# Altium footprint library Standard2.PcbLib: 423 footprints (part 21 of 27)
Each footprint in its own frame and in the unit in brackets; x right, y up, seen from the top. Pads: shape width x height; smd on the part's side, far side on the other; paste and mask are expansions set on the pad; w line width, h text height; cw(c..) or ccw(c..) is an arc to the next point about the centre after c.
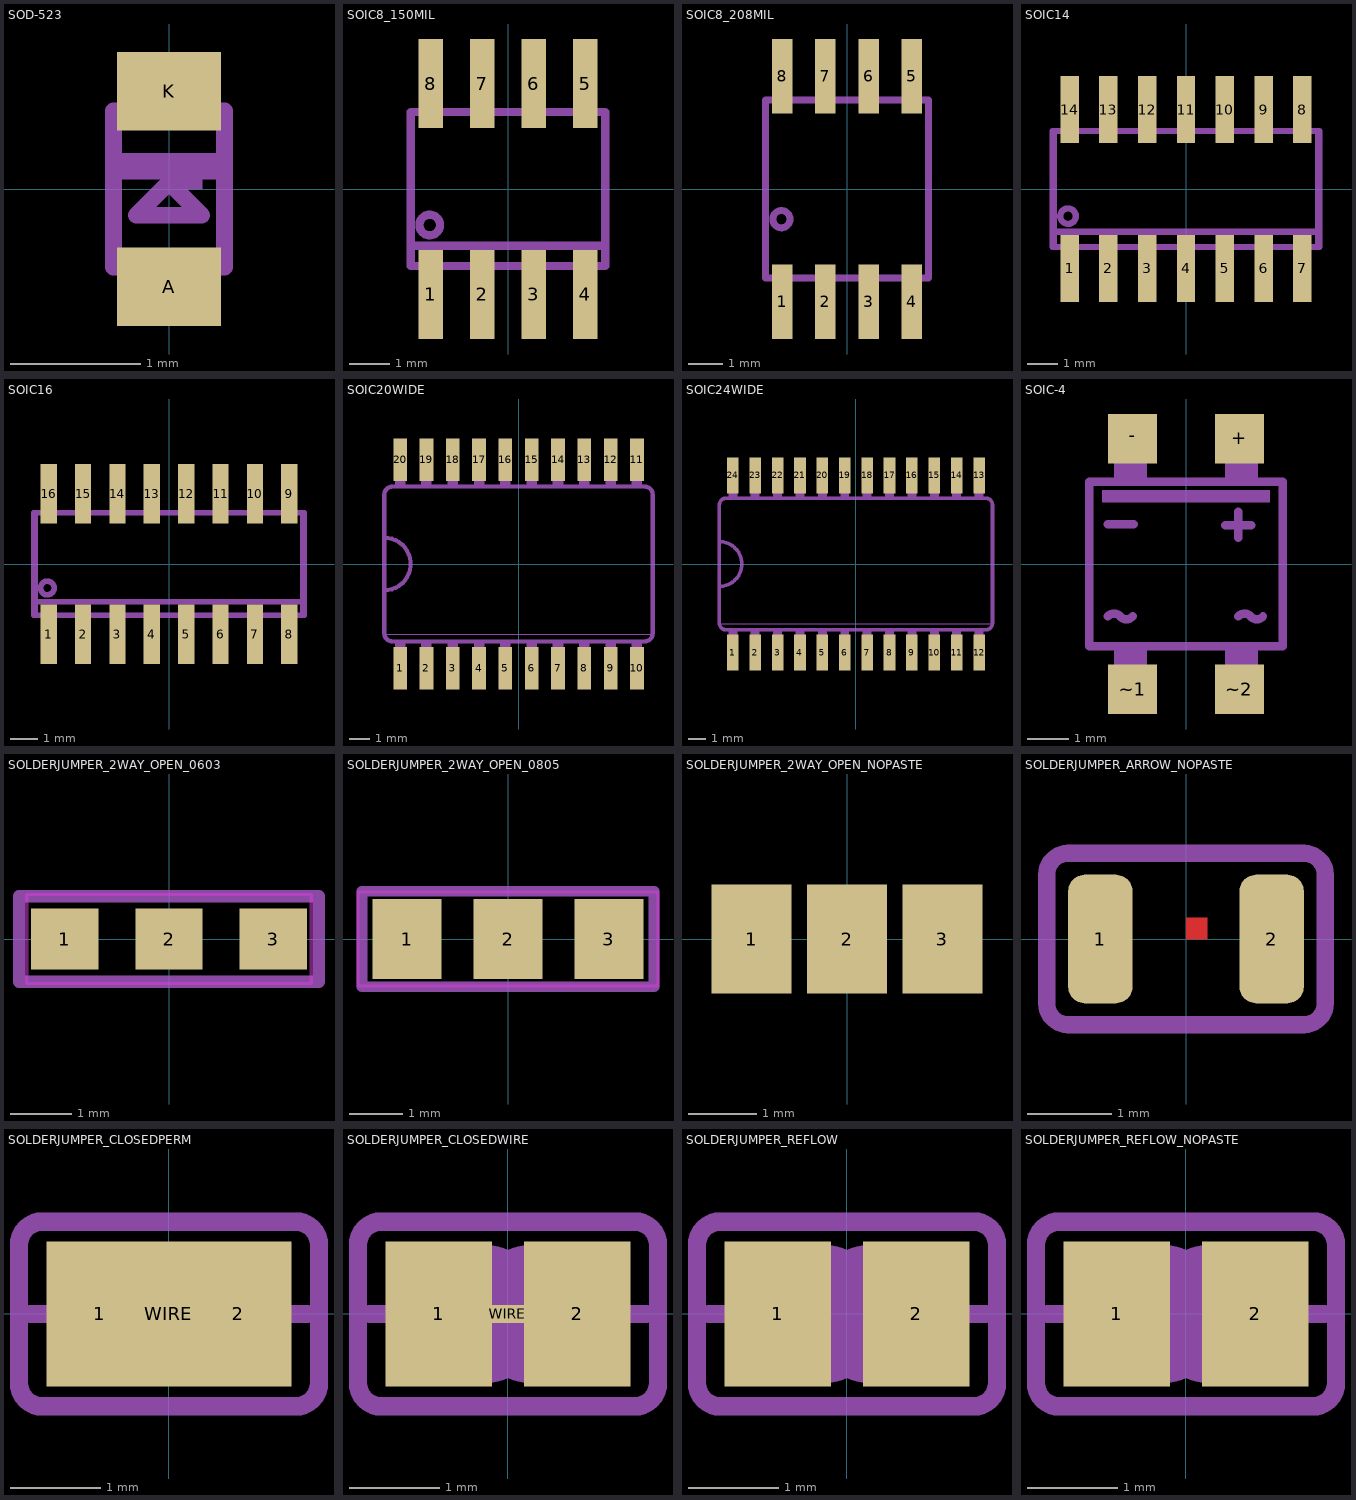
[diagram p20: the footprints below, top view; thin cyan lines are the x and y axes]

## SOD-523 [mil]
pads (2):
  rect 31.5x23.62 smd: A(0,-29.53) K(0,29.53)
Mechanical 2:
  region: -15.75,10.82 -15.75,2.94 15.75,2.93 15.75,10.81
  region: 0,0 10,0 10,10 0,10
  lines w5: -16.75,-23.62 -16.75,23.62 ; 16.75,-23.62 16.75,23.62 ; -9.84,-7.87 9.84,-7.87 0,1.97 -9.84,-7.87
Mechanical 18:
  region: -7.87,29.53 -7.87,21.65 7.87,21.65 7.87,29.53
  region: -7.87,-21.65 -7.87,-29.53 7.87,-29.53 7.87,-21.65
  lines w5: -15.75,-23.62 15.75,-23.62 ; -15.75,23.62 15.75,23.62

## SOIC8_150MIL [mm]
pads (8):
  rect 0.6x2.2 smd: 1(-1.905,-2.6) 2(-0.635,-2.6) 3(0.635,-2.6) 4(1.905,-2.6) 5(1.905,2.6) 6(0.635,2.6) 7(-0.635,2.6) 8(-1.905,2.6)
Mechanical 2:
  circle w0.203: c-1.93,-0.889 r0.254
  lines w0.203: -2.4,-1.9 -2.4,1.9 ; 2.4,-1.9 2.4,1.9
Mechanical 18:
  rectangle: -2.15,-3.1 -1.66,-2
  rectangle: -0.88,-3.1 -0.39,-2
  rectangle: 0.39,-3.1 0.88,-2
  rectangle: 1.66,-3.1 2.15,-2
  rectangle: 1.66,2 2.15,3.1
  rectangle: 0.39,2 0.88,3.1
  rectangle: -0.88,2 -0.39,3.1
  rectangle: -2.15,2 -1.66,3.1
  lines w0.203: -2.4,-1.4 -2.4,-1.9 2.4,-1.9 2.4,-1.4 ; -2.4,-1.4 -2.4,1.9 2.4,1.9 2.4,-1.4 ; -2.4,-1.4 2.4,-1.4

## SOIC8_208MIL [mm]
pads (8):
  rect 0.6x2.2 smd: 1(-1.905,-3.315) 2(-0.635,-3.315) 3(0.635,-3.315) 4(1.905,-3.315) 5(1.905,3.315) 6(0.635,3.315) 7(-0.635,3.315) 8(-1.905,3.315)
Mechanical 2:
  circle w0.203: c-1.93,-0.889 r0.254
  lines w0.203: -2.4,-1.9 -2.4,1.9 ; 2.4,-1.9 2.4,1.9
Mechanical 18:
  rectangle: -2.15,-3.815 -1.66,-2.715
  rectangle: -0.88,-3.815 -0.39,-2.715
  rectangle: 0.39,-3.815 0.88,-2.715
  rectangle: 1.66,-3.815 2.15,-2.715
  rectangle: 1.66,2.715 2.15,3.815
  rectangle: 0.39,2.715 0.88,3.815
  rectangle: -0.88,2.715 -0.39,3.815
  rectangle: -2.15,2.715 -1.66,3.815
  lines w0.203: -2.4,-2.615 2.4,-2.615 2.4,2.615 -2.4,2.615 -2.4,-2.615

## SOIC14 [mm]
pads (14):
  rect 0.6x2.2 smd: 1(-3.81,-2.6) 2(-2.54,-2.6) 3(-1.27,-2.6) 4(0,-2.6) 5(1.27,-2.6) 6(2.54,-2.6) 7(3.81,-2.6) 8(3.81,2.6) 9(2.54,2.6) 10(1.27,2.6) 11(0,2.6) 12(-1.27,2.6) 13(-2.54,2.6) 14(-3.81,2.6)
Mechanical 2:
  circle w0.203: c-3.861,-0.889 r0.254
  lines w0.203: -4.365,-1.9 -4.365,1.9 ; 4.365,-1.9 4.365,1.9
Mechanical 18:
  rectangle: -4.055,-3.1 -3.565,-2
  rectangle: -2.785,-3.1 -2.295,-2
  rectangle: -1.515,-3.1 -1.025,-2
  rectangle: -0.245,-3.1 0.245,-2
  rectangle: 2.295,2 2.785,3.1
  rectangle: 1.025,2 1.515,3.1
  rectangle: -0.245,2 0.245,3.1
  rectangle: -1.515,2 -1.025,3.1
  rectangle: 1.025,-3.1 1.515,-2
  rectangle: 2.295,-3.1 2.785,-2
  rectangle: 3.565,-3.1 4.055,-2
  rectangle: 3.565,2 4.055,3.1
  rectangle: -2.785,2 -2.295,3.1
  rectangle: -4.055,2 -3.565,3.1
  lines w0.203: -4.325,-1.4 -4.325,-1.9 4.325,-1.9 4.325,-1.4 ; -4.325,-1.4 -4.325,1.9 4.325,1.9 4.325,-1.4 ; -4.325,-1.4 4.325,-1.4

## SOIC16 [mm]
pads (16):
  rect 0.6x2.2 smd: 1(-4.445,-2.6) 2(-3.175,-2.6) 3(-1.905,-2.6) 4(-0.635,-2.6) 5(0.635,-2.6) 6(1.905,-2.6) 7(3.175,-2.6) 8(4.445,-2.6) 9(4.445,2.6) 10(3.175,2.6) 11(1.905,2.6) 12(0.635,2.6) 13(-0.635,2.6) 14(-1.905,2.6) 15(-3.175,2.6) 16(-4.445,2.6)
Mechanical 2:
  circle w0.203: c-4.496,-0.889 r0.254
  lines w0.203: -5,-1.9 -5,1.9 ; 5,-1.9 5,1.9
Mechanical 18:
  rectangle: -4.69,-3.1 -4.2,-2
  rectangle: -3.42,-3.1 -2.93,-2
  rectangle: -2.15,-3.1 -1.66,-2
  rectangle: -0.88,-3.1 -0.39,-2
  rectangle: 1.66,2 2.15,3.1
  rectangle: 0.39,2 0.88,3.1
  rectangle: -0.88,2 -0.39,3.1
  rectangle: -2.15,2 -1.66,3.1
  rectangle: 0.39,-3.1 0.88,-2
  rectangle: 1.66,-3.1 2.15,-2
  rectangle: 2.93,-3.1 3.42,-2
  rectangle: 4.2,-3.1 4.69,-2
  rectangle: 4.2,2 4.69,3.1
  rectangle: 2.93,2 3.42,3.1
  rectangle: -3.42,2 -2.93,3.1
  rectangle: -4.69,2 -4.2,3.1
  lines w0.203: -4.94,-1.4 -4.94,-1.9 4.94,-1.9 4.94,-1.4 ; -4.94,-1.4 -4.94,1.9 4.94,1.9 4.94,-1.4 ; -4.94,-1.4 4.94,-1.4

## SOIC20WIDE [mil]
pads (20):
  rect 26x80 smd: 1(-225,-198) 2(-175,-198) 3(-125,-198) 4(-75,-198) 5(-25,-198) 6(25,-198) 7(75,-198) 8(125,-198) 9(175,-198) 10(225,-198) 11(225,198) 12(175,198) 13(125,198) 14(75,198) 15(25,198) 16(-25,198) 17(-75,198) 18(-125,198) 19(-175,198) 20(-225,198)
Mechanical 2:
  rectangle: -235,-152 -215,-147
  rectangle: -185,-152 -165,-147
  rectangle: -135,-152 -115,-147
  rectangle: -85,-152 -65,-147
  rectangle: -35,-152 -15,-147
  rectangle: 15,-152 35,-147
  rectangle: 65,-152 85,-147
  rectangle: 115,-152 135,-147
  rectangle: -235,147 -215,152
  rectangle: -185,147 -165,152
  rectangle: -135,147 -115,152
  rectangle: -85,147 -65,152
  rectangle: -35,147 -15,152
  rectangle: 15,147 35,152
  rectangle: 65,147 85,152
  rectangle: 115,147 135,152
  rectangle: 165,147 185,152
  rectangle: 215,147 235,152
  rectangle: 165,-152 185,-147
  rectangle: 215,-152 235,-147
  lines w2: -255,-133 255,-133
  lines w8: -255,-50 ccw(c-255,0) -255,50 ; -255,-50 -255,50 ; -255,-50 -255,-132 ccw(c-240,-132) -240,-147 240,-147 ccw(c240,-132) 255,-132 255,132 ccw(c240,132) 240,147 -240,147 ccw(c-240,132) -255,132 -255,50
Mechanical 18:
  rectangle: -235,-210 -215,-152
  rectangle: -185,-210 -165,-152
  rectangle: -135,-210 -115,-152
  rectangle: -85,-210 -65,-152
  rectangle: -35,-210 -15,-152
  rectangle: 15,-210 35,-152
  rectangle: 65,-210 85,-152
  rectangle: 115,-210 135,-152
  rectangle: -235,152 -215,210
  rectangle: -185,152 -165,210
  rectangle: -135,152 -115,210
  rectangle: -85,152 -65,210
  rectangle: -35,152 -15,210
  rectangle: 15,152 35,210
  rectangle: 65,152 85,210
  rectangle: 115,152 135,210
  rectangle: 165,152 185,210
  rectangle: 215,152 235,210
  rectangle: 165,-210 185,-152
  rectangle: 215,-210 235,-152

## SOIC24WIDE [mil]
pads (24):
  rect 26x80 smd: 1(-275,-198) 2(-225,-198) 3(-175,-198) 4(-125,-198) 5(-75,-198) 6(-25,-198) 7(25,-198) 8(75,-198) 9(125,-198) 10(175,-198) 11(225,-198) 12(275,-198) 13(275,198) 14(225,198) 15(175,198) 16(125,198) 17(75,198) 18(25,198) 19(-25,198) 20(-75,198) 21(-125,198) 22(-175,198) 23(-225,198) 24(-275,198)
Mechanical 2:
  rectangle: -285,-152 -265,-147
  rectangle: -235,-152 -215,-147
  rectangle: -185,-152 -165,-147
  rectangle: -135,-152 -115,-147
  rectangle: -85,-152 -65,-147
  rectangle: -35,-152 -15,-147
  rectangle: 15,-152 35,-147
  rectangle: 65,-152 85,-147
  rectangle: -285,147 -265,152
  rectangle: -235,147 -215,152
  rectangle: -185,147 -165,152
  rectangle: -135,147 -115,152
  rectangle: -85,147 -65,152
  rectangle: -35,147 -15,152
  rectangle: 15,147 35,152
  rectangle: 65,147 85,152
  rectangle: 115,147 135,152
  rectangle: 165,147 185,152
  rectangle: 215,147 235,152
  rectangle: 265,147 285,152
  rectangle: 115,-152 135,-147
  rectangle: 165,-152 185,-147
  rectangle: 215,-152 235,-147
  rectangle: 265,-152 285,-147
  lines w2: -305,-133 305,-133
  lines w8: -305,-50 ccw(c-305,0) -305,50 ; -305,-50 -305,50 ; -305,-50 -305,-132 ccw(c-290,-132) -290,-147 290,-147 ccw(c290,-132) 305,-132 305,132 ccw(c290,132) 290,147 -290,147 ccw(c-290,132) -305,132 -305,50
Mechanical 18:
  rectangle: -285,-210 -265,-152
  rectangle: -235,-210 -215,-152
  rectangle: -185,-210 -165,-152
  rectangle: -135,-210 -115,-152
  rectangle: -85,-210 -65,-152
  rectangle: -35,-210 -15,-152
  rectangle: 15,-210 35,-152
  rectangle: 65,-210 85,-152
  rectangle: -285,152 -265,210
  rectangle: -235,152 -215,210
  rectangle: -185,152 -165,210
  rectangle: -135,152 -115,210
  rectangle: -85,152 -65,210
  rectangle: -35,152 -15,210
  rectangle: 15,152 35,210
  rectangle: 65,152 85,210
  rectangle: 115,152 135,210
  rectangle: 165,152 185,210
  rectangle: 215,152 235,210
  rectangle: 265,152 285,210
  rectangle: 115,-210 135,-152
  rectangle: 165,-210 185,-152
  rectangle: 215,-210 235,-152
  rectangle: 265,-210 285,-152

## SOIC-4 [mm]
pads (4):
  rect 1.2x1.2 smd: +(1.3,3.05) -(-1.3,3.05) ~1(-1.3,-3.05) ~2(1.3,-3.05)
Mechanical 2:
  rectangle: -2.05,1.5 2.05,1.8
  lines w0.203: -1.905,0.97 -1.27,0.97 ; -1.9,-1.275 cw(c-1.75,-1.401) -1.6,-1.275 ccw(c-1.45,-1.149) -1.3,-1.275 ; 0.955,0.945 1.59,0.945 ; 1.27,0.635 1.27,1.27 ; 1.275,-1.275 cw(c1.425,-1.401) 1.575,-1.275 ccw(c1.725,-1.149) 1.875,-1.275 ; -2.35,-2 2.35,-2 2.35,2 -2.35,2 -2.35,-2
Mechanical 18:
  rectangle: -1.75,2.05 -0.95,3.45
  rectangle: 0.95,2.05 1.75,3.45
  region: 1.75,-2.05 0.95,-2.05 0.95,-3.45 1.75,-3.45
  region: -0.95,-2.05 -1.75,-2.05 -1.75,-3.45 -0.95,-3.45

## SOLDERJUMPER_2WAY_OPEN_0603 [mm]
pads (3):
  rect 1.1x1 smd: 1(-1.7,0) 2(0,0) 3(1.7,0)
Keep-Out Layer:
  lines w0.051: -2.323,-0.729 -2.323,0.729 2.323,0.729 2.323,-0.729 -2.323,-0.729
Mechanical 2:
  lines w0.203: -2.45,-0.7 -2.45,0.7 2.45,0.7 2.45,-0.7 -2.45,-0.7

## SOLDERJUMPER_2WAY_OPEN_0805 [mm]
pads (3):
  rect 1.3x1.5 smd: 1(-1.9,0) 2(0,0) 3(1.9,0)
Keep-Out Layer:
  lines w0.051: -2.823,-0.883 2.823,-0.883 2.823,0.883 -2.823,0.883 -2.823,-0.883
Mechanical 2:
  lines w0.203: -2.75,-0.9 2.75,-0.9 2.75,0.9 -2.75,0.9 -2.75,-0.9

## SOLDERJUMPER_2WAY_OPEN_NOPASTE [mil]
pads (3):
  rect 46x63 smd paste-31.5: 1(-55,0) 3(55,0)
  rect 46x63 smd: 2(0,0)
Mechanical 18:
  rectangle: -20,-30 20,30

## SOLDERJUMPER_ARROW_NOPASTE [mil]
pads (2):
  rrect50% 30x60 smd paste-30 mask-30: 1(-40,0) 2(40,0)
Top Layer:
  region: 0,0 10,0 10,10 0,10
  region: 0,0 10,0 10,10 0,10
Top Solder:
  rectangle: -57.5,-32.5 57.5,32.5
Mechanical 2:
  lines w8: -65,-30 ccw(c-55,-30) -55,-40 55,-40 ccw(c55,-30) 65,-30 65,30 ccw(c55,30) 55,40 -55,40 ccw(c-55,30) -65,30 -65,-30

## SOLDERJUMPER_CLOSEDPERM [mil]
pads (3):
  rect 46x63 smd paste-31.5: 1(-30,0) 2(30,0)
  rect 25x63 smd paste-31.5: WIRE(0,0)
Top Solder:
  rectangle: -3,-36 3,36
Mechanical 2:
  lines w8: -65,-30 ccw(c-55,-30) -55,-40 55,-40 ccw(c55,-30) 65,-30 65,30 ccw(c55,30) 55,40 -55,40 ccw(c-55,30) -65,30 -65,-30
Mechanical 18:
  lines w8: -60,0 -40,0 ; 40,0 60,0
  lines w50: -10,-5 cw(c-10,0) -10,5 ; 10,-5 ccw(c10,0) 10,5

## SOLDERJUMPER_CLOSEDWIRE [mil]
pads (3):
  rect 46x63 smd paste-31.5: 1(-30,0) 2(30,0)
  rect 25x8 smd paste-12.5: WIRE(0,0)
Top Solder:
  rectangle: -3,-36 3,36
Mechanical 2:
  lines w8: -65,-30 ccw(c-55,-30) -55,-40 55,-40 ccw(c55,-30) 65,-30 65,30 ccw(c55,30) 55,40 -55,40 ccw(c-55,30) -65,30 -65,-30
Mechanical 18:
  lines w8: -60,0 -40,0 ; 40,0 60,0
  lines w50: -10,-5 cw(c-10,0) -10,5 ; 10,-5 ccw(c10,0) 10,5

## SOLDERJUMPER_REFLOW [mil]
pads (2):
  rect 46x63 smd: 1(-30,0) 2(30,0)
Top Solder:
  rectangle: -3,-36 3,36
Mechanical 2:
  lines w8: -65,-30 ccw(c-55,-30) -55,-40 55,-40 ccw(c55,-30) 65,-30 65,30 ccw(c55,30) 55,40 -55,40 ccw(c-55,30) -65,30 -65,-30
Mechanical 18:
  lines w8: -60,0 -40,0 ; 40,0 60,0
  lines w50: -10,-5 cw(c-10,0) -10,5 ; 10,-5 ccw(c10,0) 10,5

## SOLDERJUMPER_REFLOW_NOPASTE [mil]
pads (2):
  rect 46x63 smd paste-31.5: 1(-30,0) 2(30,0)
Top Solder:
  rectangle: -3,-36 3,36
Mechanical 2:
  lines w8: -65,-30 ccw(c-55,-30) -55,-40 55,-40 ccw(c55,-30) 65,-30 65,30 ccw(c55,30) 55,40 -55,40 ccw(c-55,30) -65,30 -65,-30
Mechanical 18:
  lines w8: -60,0 -40,0 ; 40,0 60,0
  lines w50: -10,-5 cw(c-10,0) -10,5 ; 10,-5 ccw(c10,0) 10,5